# Altium footprint library CONN_HDR_1.27MM_ST_SMD.PcbLib: 118 footprints (part 6 of 8)
Each footprint in its own frame and in the unit in brackets; x right, y up, seen from the top. Pads: shape width x height; smd on the part's side, far side on the other; paste and mask are expansions set on the pad; w line width, h text height; cw(c..) or ccw(c..) is an arc to the next point about the centre after c.
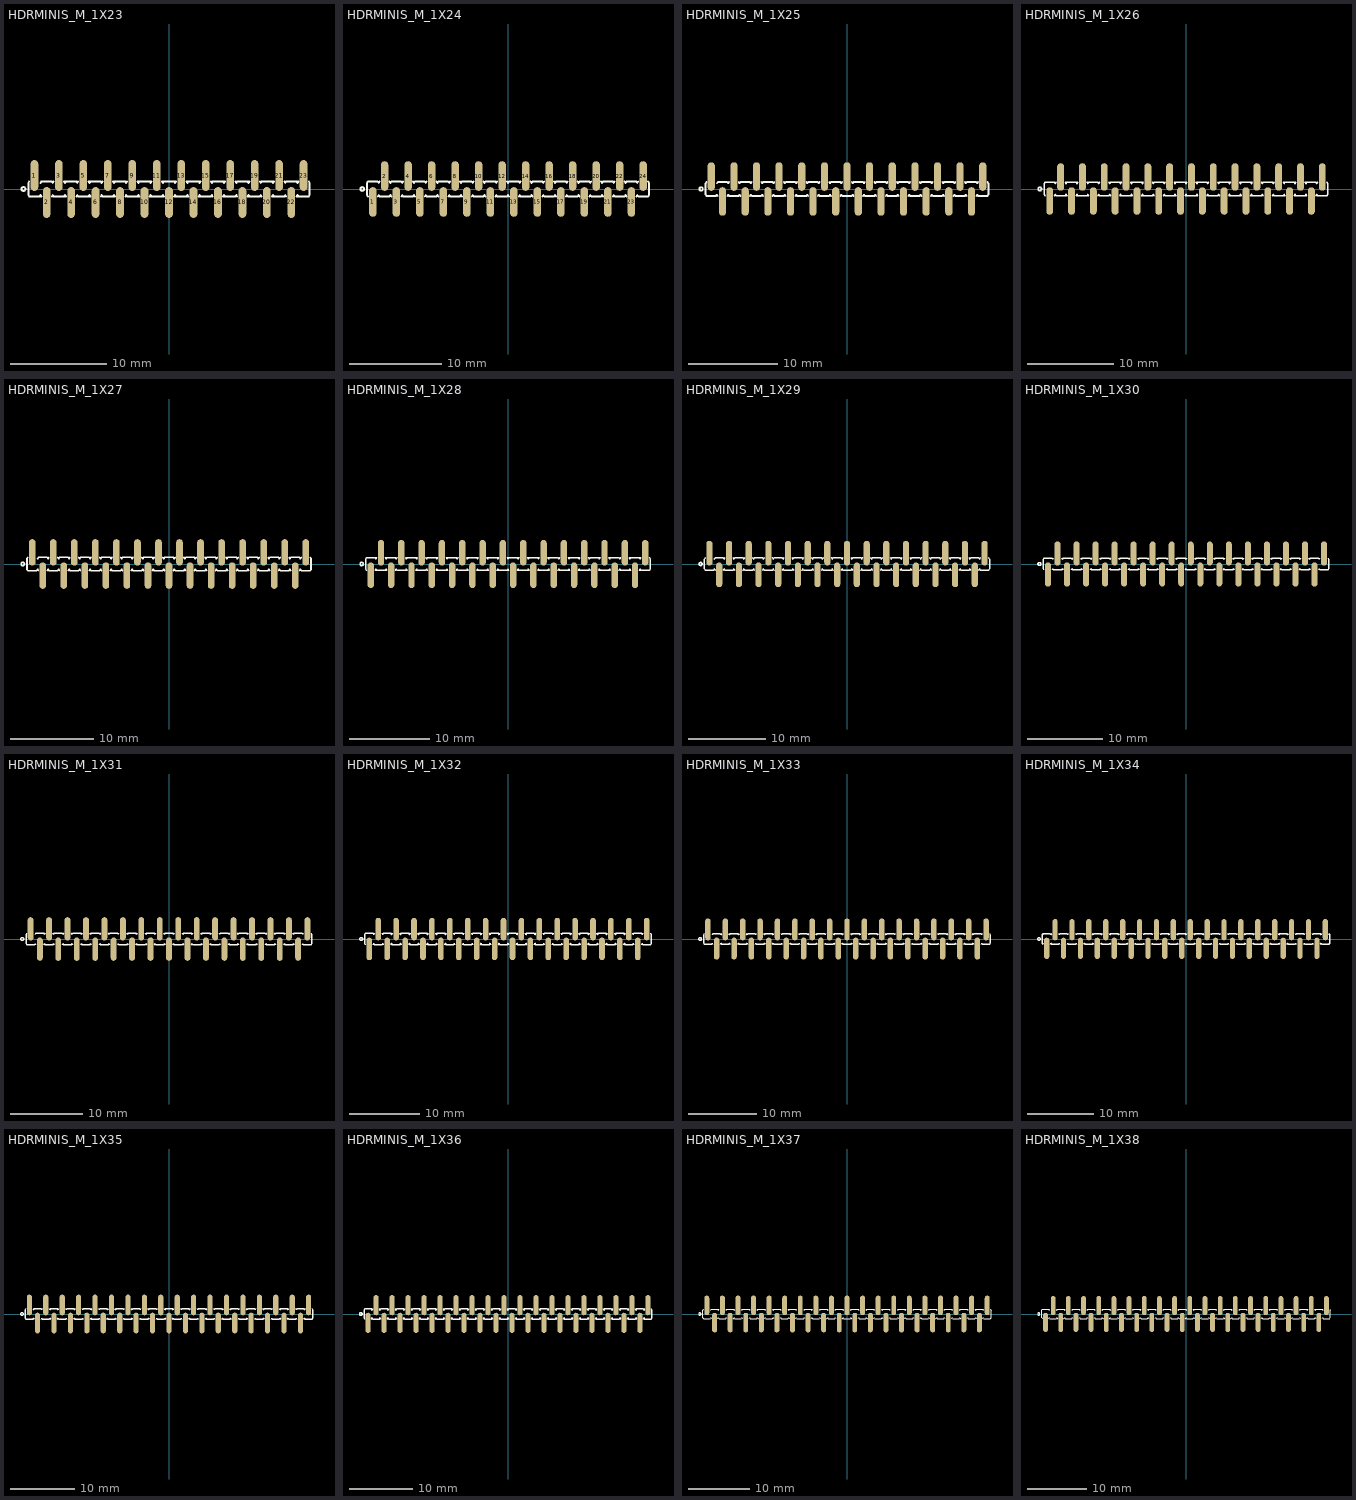
[diagram p5: the footprints below, top view; thin cyan lines are the x and y axes]

## HDRMINIS_M_1X23 [mm] "mini header (50mil pitch)"
pads (23):
  oval 0.8x3.2 smd mask+0.1: 1(-13.97,1.4) 2(-12.7,-1.4) 3(-11.43,1.4) 4(-10.16,-1.4) 5(-8.89,1.4) 6(-7.62,-1.4) 7(-6.35,1.4) 8(-5.08,-1.4) 9(-3.81,1.4) 10(-2.54,-1.4) 11(-1.27,1.4) 12(0,-1.4) 13(1.27,1.4) 14(2.54,-1.4) 15(3.81,1.4) 16(5.08,-1.4) 17(6.35,1.4) 18(7.62,-1.4) 19(8.89,1.4) 20(10.16,-1.4) 21(11.43,1.4) 22(12.7,-1.4) 23(13.97,1.4)
Top Overlay:
  circle w0.2: c-15.113,0 r0.2
  lines w0.2: -14.506,0.8 -14.605,0.635 -14.605,-0.635 -14.506,-0.8 -13.434,-0.8 -13.335,-0.635 -13.236,-0.8 ; -13.335,0.635 -13.236,0.8 -12.164,0.8 -12.065,0.635 -11.966,0.8 ; -12.164,-0.8 -12.065,-0.635 -11.966,-0.8 -10.894,-0.8 -10.795,-0.635 -10.696,-0.8 ; -10.894,0.8 -10.795,0.635 -10.696,0.8 -9.624,0.8 -9.525,0.635 -9.426,0.8 ; -9.624,-0.8 -9.525,-0.635 -9.426,-0.8 -8.354,-0.8 -8.255,-0.635 -8.156,-0.8 ; -8.354,0.8 -8.255,0.635 -8.156,0.8 -7.084,0.8 -6.985,0.635 -6.886,0.8 ; -7.084,-0.8 -6.985,-0.635 -6.886,-0.8 -5.814,-0.8 -5.715,-0.635 -5.616,-0.8 ; -5.814,0.8 -5.715,0.635 -5.616,0.8 -4.544,0.8 -4.445,0.635 -4.346,0.8 ; -4.544,-0.8 -4.445,-0.635 -4.346,-0.8 -3.274,-0.8 -3.175,-0.635 -3.076,-0.8 ; -3.274,0.8 -3.175,0.635 -3.076,0.8 -2.004,0.8 -1.905,0.635 -1.806,0.8 ; -2.004,-0.8 -1.905,-0.635 -1.806,-0.8 -0.734,-0.8 -0.635,-0.635 -0.536,-0.8 ; -0.734,0.8 -0.635,0.635 -0.536,0.8 0.536,0.8 0.635,0.635 0.734,0.8 ; 0.536,-0.8 0.635,-0.635 0.734,-0.8 1.806,-0.8 1.905,-0.635 2.004,-0.8 ; 1.806,0.8 1.905,0.635 2.004,0.8 3.076,0.8 3.175,0.635 3.274,0.8 ; 3.076,-0.8 3.175,-0.635 3.274,-0.8 4.346,-0.8 4.445,-0.635 4.544,-0.8 ; 4.346,0.8 4.445,0.635 4.544,0.8 5.616,0.8 5.715,0.635 5.814,0.8 ; 5.616,-0.8 5.715,-0.635 5.814,-0.8 6.886,-0.8 6.985,-0.635 7.084,-0.8 ; 6.886,0.8 6.985,0.635 7.084,0.8 8.156,0.8 8.255,0.635 8.354,0.8 ; 8.156,-0.8 8.255,-0.635 8.354,-0.8 9.426,-0.8 9.525,-0.635 9.624,-0.8 ; 9.426,0.8 9.525,0.635 9.624,0.8 10.696,0.8 10.795,0.635 10.894,0.8 ; 10.696,-0.8 10.795,-0.635 10.894,-0.8 11.966,-0.8 12.065,-0.635 12.164,-0.8 ; 11.966,0.8 12.065,0.635 12.164,0.8 13.236,0.8 13.335,0.635 13.434,0.8 ; 13.236,-0.8 13.335,-0.635 13.434,-0.8 14.506,-0.8 14.605,-0.635 14.605,0.635 14.506,0.8
3D body "BD021-02A-A1-0350-0200-0550-LB.stp": height 5.5, standoff 0, extent 12.065,-2.75 14.605,2.75
3D body "BD021-02A-A1-0350-0200-0550-LB.stp": height 5.5, standoff 0, extent 9.525,-2.75 12.065,2.75
3D body "BD021-02A-A1-0350-0200-0550-LB.stp": height 5.5, standoff 0, extent 6.985,-2.75 9.525,2.75
3D body "BD021-02A-A1-0350-0200-0550-LB.stp": height 5.5, standoff 0, extent 4.445,-2.75 6.985,2.75
3D body "BD021-02A-A1-0350-0200-0550-LB.stp": height 5.5, standoff 0, extent 1.905,-2.75 4.445,2.75
3D body "BD021-02A-A1-0350-0200-0550-LB.stp": height 5.5, standoff 0, extent -0.635,-2.75 1.905,2.75
3D body "BD021-02A-A1-0350-0200-0550-LB.stp": height 5.5, standoff 0, extent -3.175,-2.75 -0.635,2.75
3D body "BD021-02A-A1-0350-0200-0550-LB.stp": height 5.5, standoff 0, extent -5.715,-2.75 -3.175,2.75
3D body "BD021-02A-A1-0350-0200-0550-LB.stp": height 5.5, standoff 0, extent -8.255,-2.75 -5.715,2.75
3D body "BD021-02A-A1-0350-0200-0550-LB.stp": height 5.5, standoff 0, extent -10.795,-2.75 -8.255,2.75
3D body "BD021-03A-A1-0350-0200-0550-LB.stp": height 5.5, standoff 0, extent -14.61,-2.75 -10.8,2.75

## HDRMINIS_M_1X24 [mm] "mini header (50mil pitch)"
pads (24):
  oval 0.8x3.2 smd mask+0.1: 1(-14.605,-1.4) 2(-13.335,1.4) 3(-12.065,-1.4) 4(-10.795,1.4) 5(-9.525,-1.4) 6(-8.255,1.4) 7(-6.985,-1.4) 8(-5.715,1.4) 9(-4.445,-1.4) 10(-3.175,1.4) 11(-1.905,-1.4) 12(-0.635,1.4) 13(0.635,-1.4) 14(1.905,1.4) 15(3.175,-1.4) 16(4.445,1.4) 17(5.715,-1.4) 18(6.985,1.4) 19(8.255,-1.4) 20(9.525,1.4) 21(10.795,-1.4) 22(12.065,1.4) 23(13.335,-1.4) 24(14.605,1.4)
Top Overlay:
  circle w0.2: c-15.748,0 r0.2
  lines w0.2: -15.141,-0.8 -15.24,-0.635 -15.24,0.635 -15.141,0.8 -14.069,0.8 -13.97,0.635 -13.871,0.8 ; -14.069,-0.8 -13.97,-0.635 -13.871,-0.8 -12.799,-0.8 -12.7,-0.635 -12.601,-0.8 ; -12.799,0.8 -12.7,0.635 -12.601,0.8 -11.529,0.8 -11.43,0.635 -11.331,0.8 ; -11.529,-0.8 -11.43,-0.635 -11.331,-0.8 -10.259,-0.8 -10.16,-0.635 -10.061,-0.8 ; -10.259,0.8 -10.16,0.635 -10.061,0.8 -8.989,0.8 -8.89,0.635 -8.791,0.8 ; -8.989,-0.8 -8.89,-0.635 -8.791,-0.8 -7.719,-0.8 -7.62,-0.635 -7.521,-0.8 ; -7.719,0.8 -7.62,0.635 -7.521,0.8 -6.449,0.8 -6.35,0.635 -6.251,0.8 ; -6.449,-0.8 -6.35,-0.635 -6.251,-0.8 -5.179,-0.8 -5.08,-0.635 -4.981,-0.8 ; -5.179,0.8 -5.08,0.635 -4.981,0.8 -3.909,0.8 -3.81,0.635 -3.711,0.8 ; -3.909,-0.8 -3.81,-0.635 -3.711,-0.8 -2.639,-0.8 -2.54,-0.635 -2.441,-0.8 ; -2.639,0.8 -2.54,0.635 -2.441,0.8 -1.369,0.8 -1.27,0.635 -1.171,0.8 ; -1.369,-0.8 -1.27,-0.635 -1.171,-0.8 -0.099,-0.8 0,-0.635 0.099,-0.8 ; -0.099,0.8 0,0.635 0.099,0.8 1.171,0.8 1.27,0.635 1.369,0.8 ; 1.171,-0.8 1.27,-0.635 1.369,-0.8 2.441,-0.8 2.54,-0.635 2.639,-0.8 ; 2.441,0.8 2.54,0.635 2.639,0.8 3.711,0.8 3.81,0.635 3.909,0.8 ; 3.711,-0.8 3.81,-0.635 3.909,-0.8 4.981,-0.8 5.08,-0.635 5.179,-0.8 ; 4.981,0.8 5.08,0.635 5.179,0.8 6.251,0.8 6.35,0.635 6.449,0.8 ; 6.251,-0.8 6.35,-0.635 6.449,-0.8 7.521,-0.8 7.62,-0.635 7.719,-0.8 ; 7.521,0.8 7.62,0.635 7.719,0.8 8.791,0.8 8.89,0.635 8.989,0.8 ; 8.791,-0.8 8.89,-0.635 8.989,-0.8 10.061,-0.8 10.16,-0.635 10.259,-0.8 ; 10.061,0.8 10.16,0.635 10.259,0.8 11.331,0.8 11.43,0.635 11.529,0.8 ; 11.331,-0.8 11.43,-0.635 11.529,-0.8 12.601,-0.8 12.7,-0.635 12.799,-0.8 ; 12.601,0.8 12.7,0.635 12.799,0.8 13.871,0.8 13.97,0.635 14.069,0.8 ; 13.871,-0.8 13.97,-0.635 14.069,-0.8 15.141,-0.8 15.24,-0.635 15.24,0.635 15.141,0.8
3D body "BD021-02A-A1-0350-0200-0550-LB.stp": height 5.5, standoff 0, extent -15.24,-2.75 -12.7,2.75
3D body "BD021-02A-A1-0350-0200-0550-LB.stp": height 5.5, standoff 0, extent -12.7,-2.75 -10.16,2.75
3D body "BD021-02A-A1-0350-0200-0550-LB.stp": height 5.5, standoff 0, extent -10.16,-2.75 -7.62,2.75
3D body "BD021-02A-A1-0350-0200-0550-LB.stp": height 5.5, standoff 0, extent -7.62,-2.75 -5.08,2.75
3D body "BD021-02A-A1-0350-0200-0550-LB.stp": height 5.5, standoff 0, extent -5.08,-2.75 -2.54,2.75
3D body "BD021-02A-A1-0350-0200-0550-LB.stp": height 5.5, standoff 0, extent -2.54,-2.75 0,2.75
3D body "BD021-02A-A1-0350-0200-0550-LB.stp": height 5.5, standoff 0, extent 0,-2.75 2.54,2.75
3D body "BD021-02A-A1-0350-0200-0550-LB.stp": height 5.5, standoff 0, extent 2.54,-2.75 5.08,2.75
3D body "BD021-02A-A1-0350-0200-0550-LB.stp": height 5.5, standoff 0, extent 5.08,-2.75 7.62,2.75
3D body "BD021-02A-A1-0350-0200-0550-LB.stp": height 5.5, standoff 0, extent 7.62,-2.75 10.16,2.75
3D body "BD021-02A-A1-0350-0200-0550-LB.stp": height 5.5, standoff 0, extent 10.16,-2.75 12.7,2.75
3D body "BD021-02A-A1-0350-0200-0550-LB.stp": height 5.5, standoff 0, extent 12.7,-2.75 15.24,2.75

## HDRMINIS_M_1X25 [mm] "mini header (50mil pitch)"
pads (25):
  oval 0.8x3.2 smd mask+0.1: 1(-15.24,1.4) 2(-13.97,-1.4) 3(-12.7,1.4) 4(-11.43,-1.4) 5(-10.16,1.4) 6(-8.89,-1.4) 7(-7.62,1.4) 8(-6.35,-1.4) 9(-5.08,1.4) 10(-3.81,-1.4) 11(-2.54,1.4) 12(-1.27,-1.4) 13(0,1.4) 14(1.27,-1.4) 15(2.54,1.4) 16(3.81,-1.4) 17(5.08,1.4) 18(6.35,-1.4) 19(7.62,1.4) 20(8.89,-1.4) 21(10.16,1.4) 22(11.43,-1.4) 23(12.7,1.4) 24(13.97,-1.4) 25(15.24,1.4)
Top Overlay:
  circle w0.2: c-16.383,0 r0.2
  lines w0.2: -15.776,0.8 -15.875,0.635 -15.875,-0.635 -15.776,-0.8 -14.704,-0.8 -14.605,-0.635 -14.506,-0.8 ; -14.605,0.635 -14.506,0.8 -13.434,0.8 -13.335,0.635 -13.236,0.8 ; -13.434,-0.8 -13.335,-0.635 -13.236,-0.8 -12.164,-0.8 -12.065,-0.635 -11.966,-0.8 ; -12.164,0.8 -12.065,0.635 -11.966,0.8 -10.894,0.8 -10.795,0.635 -10.696,0.8 ; -10.894,-0.8 -10.795,-0.635 -10.696,-0.8 -9.624,-0.8 -9.525,-0.635 -9.426,-0.8 ; -9.624,0.8 -9.525,0.635 -9.426,0.8 -8.354,0.8 -8.255,0.635 -8.156,0.8 ; -8.354,-0.8 -8.255,-0.635 -8.156,-0.8 -7.084,-0.8 -6.985,-0.635 -6.886,-0.8 ; -7.084,0.8 -6.985,0.635 -6.886,0.8 -5.814,0.8 -5.715,0.635 -5.616,0.8 ; -5.814,-0.8 -5.715,-0.635 -5.616,-0.8 -4.544,-0.8 -4.445,-0.635 -4.346,-0.8 ; -4.544,0.8 -4.445,0.635 -4.346,0.8 -3.274,0.8 -3.175,0.635 -3.076,0.8 ; -3.274,-0.8 -3.175,-0.635 -3.076,-0.8 -2.004,-0.8 -1.905,-0.635 -1.806,-0.8 ; -2.004,0.8 -1.905,0.635 -1.806,0.8 -0.734,0.8 -0.635,0.635 -0.536,0.8 ; -0.734,-0.8 -0.635,-0.635 -0.536,-0.8 0.536,-0.8 0.635,-0.635 0.734,-0.8 ; 0.536,0.8 0.635,0.635 0.734,0.8 1.806,0.8 1.905,0.635 2.004,0.8 ; 1.806,-0.8 1.905,-0.635 2.004,-0.8 3.076,-0.8 3.175,-0.635 3.274,-0.8 ; 3.076,0.8 3.175,0.635 3.274,0.8 4.346,0.8 4.445,0.635 4.544,0.8 ; 4.346,-0.8 4.445,-0.635 4.544,-0.8 5.616,-0.8 5.715,-0.635 5.814,-0.8 ; 5.616,0.8 5.715,0.635 5.814,0.8 6.886,0.8 6.985,0.635 7.084,0.8 ; 6.886,-0.8 6.985,-0.635 7.084,-0.8 8.156,-0.8 8.255,-0.635 8.354,-0.8 ; 8.156,0.8 8.255,0.635 8.354,0.8 9.426,0.8 9.525,0.635 9.624,0.8 ; 9.426,-0.8 9.525,-0.635 9.624,-0.8 10.696,-0.8 10.795,-0.635 10.894,-0.8 ; 10.696,0.8 10.795,0.635 10.894,0.8 11.966,0.8 12.065,0.635 12.164,0.8 ; 11.966,-0.8 12.065,-0.635 12.164,-0.8 13.236,-0.8 13.335,-0.635 13.434,-0.8 ; 13.236,0.8 13.335,0.635 13.434,0.8 14.506,0.8 14.605,0.635 14.704,0.8 ; 14.506,-0.8 14.605,-0.635 14.704,-0.8 15.776,-0.8 15.875,-0.635 15.875,0.635 15.776,0.8
3D body "BD021-03A-A1-0350-0200-0550-LB.stp": height 5.5, standoff 0, extent -15.88,-2.75 -12.07,2.75
3D body "BD021-02A-A1-0350-0200-0550-LB.stp": height 5.5, standoff 0, extent -12.065,-2.75 -9.525,2.75
3D body "BD021-02A-A1-0350-0200-0550-LB.stp": height 5.5, standoff 0, extent -9.525,-2.75 -6.985,2.75
3D body "BD021-02A-A1-0350-0200-0550-LB.stp": height 5.5, standoff 0, extent -6.985,-2.75 -4.445,2.75
3D body "BD021-02A-A1-0350-0200-0550-LB.stp": height 5.5, standoff 0, extent -4.445,-2.75 -1.905,2.75
3D body "BD021-02A-A1-0350-0200-0550-LB.stp": height 5.5, standoff 0, extent -1.905,-2.75 0.635,2.75
3D body "BD021-02A-A1-0350-0200-0550-LB.stp": height 5.5, standoff 0, extent 0.635,-2.75 3.175,2.75
3D body "BD021-02A-A1-0350-0200-0550-LB.stp": height 5.5, standoff 0, extent 3.175,-2.75 5.715,2.75
3D body "BD021-02A-A1-0350-0200-0550-LB.stp": height 5.5, standoff 0, extent 5.715,-2.75 8.255,2.75
3D body "BD021-02A-A1-0350-0200-0550-LB.stp": height 5.5, standoff 0, extent 8.255,-2.75 10.795,2.75
3D body "BD021-02A-A1-0350-0200-0550-LB.stp": height 5.5, standoff 0, extent 10.795,-2.75 13.335,2.75
3D body "BD021-02A-A1-0350-0200-0550-LB.stp": height 5.5, standoff 0, extent 13.335,-2.75 15.875,2.75

## HDRMINIS_M_1X26 [mm] "mini header (50mil pitch)"
pads (26):
  oval 0.8x3.2 smd mask+0.1: 1(-15.875,-1.4) 2(-14.605,1.4) 3(-13.335,-1.4) 4(-12.065,1.4) 5(-10.795,-1.4) 6(-9.525,1.4) 7(-8.255,-1.4) 8(-6.985,1.4) 9(-5.715,-1.4) 10(-4.445,1.4) 11(-3.175,-1.4) 12(-1.905,1.4) 13(-0.635,-1.4) 14(0.635,1.4) 15(1.905,-1.4) 16(3.175,1.4) 17(4.445,-1.4) 18(5.715,1.4) 19(6.985,-1.4) 20(8.255,1.4) 21(9.525,-1.4) 22(10.795,1.4) 23(12.065,-1.4) 24(13.335,1.4) 25(14.605,-1.4) 26(15.875,1.4)
Top Overlay:
  circle w0.2: c-17.018,0 r0.2
  lines w0.2: -16.411,-0.8 -16.51,-0.635 -16.51,0.635 -16.411,0.8 -15.339,0.8 -15.24,0.635 -15.141,0.8 ; -15.339,-0.8 -15.24,-0.635 -15.141,-0.8 -14.069,-0.8 -13.97,-0.635 -13.871,-0.8 ; -14.069,0.8 -13.97,0.635 -13.871,0.8 -12.799,0.8 -12.7,0.635 -12.601,0.8 ; -12.799,-0.8 -12.7,-0.635 -12.601,-0.8 -11.529,-0.8 -11.43,-0.635 -11.331,-0.8 ; -11.529,0.8 -11.43,0.635 -11.331,0.8 -10.259,0.8 -10.16,0.635 -10.061,0.8 ; -10.259,-0.8 -10.16,-0.635 -10.061,-0.8 -8.989,-0.8 -8.89,-0.635 -8.791,-0.8 ; -8.989,0.8 -8.89,0.635 -8.791,0.8 -7.719,0.8 -7.62,0.635 -7.521,0.8 ; -7.719,-0.8 -7.62,-0.635 -7.521,-0.8 -6.449,-0.8 -6.35,-0.635 -6.251,-0.8 ; -6.449,0.8 -6.35,0.635 -6.251,0.8 -5.179,0.8 -5.08,0.635 -4.981,0.8 ; -5.179,-0.8 -5.08,-0.635 -4.981,-0.8 -3.909,-0.8 -3.81,-0.635 -3.711,-0.8 ; -3.909,0.8 -3.81,0.635 -3.711,0.8 -2.639,0.8 -2.54,0.635 -2.441,0.8 ; -2.639,-0.8 -2.54,-0.635 -2.441,-0.8 -1.369,-0.8 -1.27,-0.635 -1.171,-0.8 ; -1.369,0.8 -1.27,0.635 -1.171,0.8 -0.099,0.8 0,0.635 0.099,0.8 ; -0.099,-0.8 0,-0.635 0.099,-0.8 1.171,-0.8 1.27,-0.635 1.369,-0.8 ; 1.171,0.8 1.27,0.635 1.369,0.8 2.441,0.8 2.54,0.635 2.639,0.8 ; 2.441,-0.8 2.54,-0.635 2.639,-0.8 3.711,-0.8 3.81,-0.635 3.909,-0.8 ; 3.711,0.8 3.81,0.635 3.909,0.8 4.981,0.8 5.08,0.635 5.179,0.8 ; 4.981,-0.8 5.08,-0.635 5.179,-0.8 6.251,-0.8 6.35,-0.635 6.449,-0.8 ; 6.251,0.8 6.35,0.635 6.449,0.8 7.521,0.8 7.62,0.635 7.719,0.8 ; 7.521,-0.8 7.62,-0.635 7.719,-0.8 8.791,-0.8 8.89,-0.635 8.989,-0.8 ; 8.791,0.8 8.89,0.635 8.989,0.8 10.061,0.8 10.16,0.635 10.259,0.8 ; 10.061,-0.8 10.16,-0.635 10.259,-0.8 11.331,-0.8 11.43,-0.635 11.529,-0.8 ; 11.331,0.8 11.43,0.635 11.529,0.8 12.601,0.8 12.7,0.635 12.799,0.8 ; 12.601,-0.8 12.7,-0.635 12.799,-0.8 13.871,-0.8 13.97,-0.635 14.069,-0.8 ; 13.871,0.8 13.97,0.635 14.069,0.8 15.141,0.8 15.24,0.635 15.339,0.8 ; 15.141,-0.8 15.24,-0.635 15.339,-0.8 16.411,-0.8 16.51,-0.635 16.51,0.635 16.411,0.8
3D body "BD021-02A-A1-0350-0200-0550-LB.stp": height 5.5, standoff 0, extent -16.51,-2.75 -13.97,2.75
3D body "BD021-02A-A1-0350-0200-0550-LB.stp": height 5.5, standoff 0, extent -13.97,-2.75 -11.43,2.75
3D body "BD021-02A-A1-0350-0200-0550-LB.stp": height 5.5, standoff 0, extent -11.43,-2.75 -8.89,2.75
3D body "BD021-02A-A1-0350-0200-0550-LB.stp": height 5.5, standoff 0, extent -8.89,-2.75 -6.35,2.75
3D body "BD021-02A-A1-0350-0200-0550-LB.stp": height 5.5, standoff 0, extent -6.35,-2.75 -3.81,2.75
3D body "BD021-02A-A1-0350-0200-0550-LB.stp": height 5.5, standoff 0, extent -3.81,-2.75 -1.27,2.75
3D body "BD021-02A-A1-0350-0200-0550-LB.stp": height 5.5, standoff 0, extent -1.27,-2.75 1.27,2.75
3D body "BD021-02A-A1-0350-0200-0550-LB.stp": height 5.5, standoff 0, extent 1.27,-2.75 3.81,2.75
3D body "BD021-02A-A1-0350-0200-0550-LB.stp": height 5.5, standoff 0, extent 3.81,-2.75 6.35,2.75
3D body "BD021-02A-A1-0350-0200-0550-LB.stp": height 5.5, standoff 0, extent 6.35,-2.75 8.89,2.75
3D body "BD021-02A-A1-0350-0200-0550-LB.stp": height 5.5, standoff 0, extent 8.89,-2.75 11.43,2.75
3D body "BD021-02A-A1-0350-0200-0550-LB.stp": height 5.5, standoff 0, extent 11.43,-2.75 13.97,2.75
3D body "BD021-02A-A1-0350-0200-0550-LB.stp": height 5.5, standoff 0, extent 13.97,-2.75 16.51,2.75

## HDRMINIS_M_1X27 [mm] "mini header (50mil pitch)"
pads (27):
  oval 0.8x3.2 smd mask+0.1: 1(-16.51,1.4) 2(-15.24,-1.4) 3(-13.97,1.4) 4(-12.7,-1.4) 5(-11.43,1.4) 6(-10.16,-1.4) 7(-8.89,1.4) 8(-7.62,-1.4) 9(-6.35,1.4) 10(-5.08,-1.4) 11(-3.81,1.4) 12(-2.54,-1.4) 13(-1.27,1.4) 14(0,-1.4) 15(1.27,1.4) 16(2.54,-1.4) 17(3.81,1.4) 18(5.08,-1.4) 19(6.35,1.4) 20(7.62,-1.4) 21(8.89,1.4) 22(10.16,-1.4) 23(11.43,1.4) 24(12.7,-1.4) 25(13.97,1.4) 26(15.24,-1.4) 27(16.51,1.4)
Top Overlay:
  circle w0.2: c-17.653,0 r0.2
  lines w0.2: -17.046,0.8 -17.145,0.635 -17.145,-0.635 -17.046,-0.8 -15.974,-0.8 -15.875,-0.635 -15.776,-0.8 ; -15.875,0.635 -15.776,0.8 -14.704,0.8 -14.605,0.635 -14.506,0.8 ; -14.704,-0.8 -14.605,-0.635 -14.506,-0.8 -13.434,-0.8 -13.335,-0.635 -13.236,-0.8 ; -13.434,0.8 -13.335,0.635 -13.236,0.8 -12.164,0.8 -12.065,0.635 -11.966,0.8 ; -12.164,-0.8 -12.065,-0.635 -11.966,-0.8 -10.894,-0.8 -10.795,-0.635 -10.696,-0.8 ; -10.894,0.8 -10.795,0.635 -10.696,0.8 -9.624,0.8 -9.525,0.635 -9.426,0.8 ; -9.624,-0.8 -9.525,-0.635 -9.426,-0.8 -8.354,-0.8 -8.255,-0.635 -8.156,-0.8 ; -8.354,0.8 -8.255,0.635 -8.156,0.8 -7.084,0.8 -6.985,0.635 -6.886,0.8 ; -7.084,-0.8 -6.985,-0.635 -6.886,-0.8 -5.814,-0.8 -5.715,-0.635 -5.616,-0.8 ; -5.814,0.8 -5.715,0.635 -5.616,0.8 -4.544,0.8 -4.445,0.635 -4.346,0.8 ; -4.544,-0.8 -4.445,-0.635 -4.346,-0.8 -3.274,-0.8 -3.175,-0.635 -3.076,-0.8 ; -3.274,0.8 -3.175,0.635 -3.076,0.8 -2.004,0.8 -1.905,0.635 -1.806,0.8 ; -2.004,-0.8 -1.905,-0.635 -1.806,-0.8 -0.734,-0.8 -0.635,-0.635 -0.536,-0.8 ; -0.734,0.8 -0.635,0.635 -0.536,0.8 0.536,0.8 0.635,0.635 0.734,0.8 ; 0.536,-0.8 0.635,-0.635 0.734,-0.8 1.806,-0.8 1.905,-0.635 2.004,-0.8 ; 1.806,0.8 1.905,0.635 2.004,0.8 3.076,0.8 3.175,0.635 3.274,0.8 ; 3.076,-0.8 3.175,-0.635 3.274,-0.8 4.346,-0.8 4.445,-0.635 4.544,-0.8 ; 4.346,0.8 4.445,0.635 4.544,0.8 5.616,0.8 5.715,0.635 5.814,0.8 ; 5.616,-0.8 5.715,-0.635 5.814,-0.8 6.886,-0.8 6.985,-0.635 7.084,-0.8 ; 6.886,0.8 6.985,0.635 7.084,0.8 8.156,0.8 8.255,0.635 8.354,0.8 ; 8.156,-0.8 8.255,-0.635 8.354,-0.8 9.426,-0.8 9.525,-0.635 9.624,-0.8 ; 9.426,0.8 9.525,0.635 9.624,0.8 10.696,0.8 10.795,0.635 10.894,0.8 ; 10.696,-0.8 10.795,-0.635 10.894,-0.8 11.966,-0.8 12.065,-0.635 12.164,-0.8 ; 11.966,0.8 12.065,0.635 12.164,0.8 13.236,0.8 13.335,0.635 13.434,0.8 ; 13.236,-0.8 13.335,-0.635 13.434,-0.8 14.506,-0.8 14.605,-0.635 14.704,-0.8 ; 14.506,0.8 14.605,0.635 14.704,0.8 15.776,0.8 15.875,0.635 15.974,0.8 ; 15.776,-0.8 15.875,-0.635 15.974,-0.8 17.046,-0.8 17.145,-0.635 17.145,0.635 17.046,0.8
3D body "BD021-02A-A1-0350-0200-0550-LB.stp": height 5.5, standoff 0, extent 14.605,-2.75 17.145,2.75
3D body "BD021-02A-A1-0350-0200-0550-LB.stp": height 5.5, standoff 0, extent 12.065,-2.75 14.605,2.75
3D body "BD021-02A-A1-0350-0200-0550-LB.stp": height 5.5, standoff 0, extent 9.525,-2.75 12.065,2.75
3D body "BD021-02A-A1-0350-0200-0550-LB.stp": height 5.5, standoff 0, extent 6.985,-2.75 9.525,2.75
3D body "BD021-02A-A1-0350-0200-0550-LB.stp": height 5.5, standoff 0, extent 4.445,-2.75 6.985,2.75
3D body "BD021-02A-A1-0350-0200-0550-LB.stp": height 5.5, standoff 0, extent 1.905,-2.75 4.445,2.75
3D body "BD021-02A-A1-0350-0200-0550-LB.stp": height 5.5, standoff 0, extent -0.635,-2.75 1.905,2.75
3D body "BD021-02A-A1-0350-0200-0550-LB.stp": height 5.5, standoff 0, extent -3.175,-2.75 -0.635,2.75
3D body "BD021-02A-A1-0350-0200-0550-LB.stp": height 5.5, standoff 0, extent -5.715,-2.75 -3.175,2.75
3D body "BD021-02A-A1-0350-0200-0550-LB.stp": height 5.5, standoff 0, extent -8.255,-2.75 -5.715,2.75
3D body "BD021-02A-A1-0350-0200-0550-LB.stp": height 5.5, standoff 0, extent -10.795,-2.75 -8.255,2.75
3D body "BD021-02A-A1-0350-0200-0550-LB.stp": height 5.5, standoff 0, extent -13.335,-2.75 -10.795,2.75
3D body "BD021-03A-A1-0350-0200-0550-LB.stp": height 5.5, standoff 0, extent -17.15,-2.75 -13.34,2.75

## HDRMINIS_M_1X28 [mm] "mini header (50mil pitch)"
pads (28):
  oval 0.8x3.2 smd mask+0.1: 1(-17.145,-1.4) 2(-15.875,1.4) 3(-14.605,-1.4) 4(-13.335,1.4) 5(-12.065,-1.4) 6(-10.795,1.4) 7(-9.525,-1.4) 8(-8.255,1.4) 9(-6.985,-1.4) 10(-5.715,1.4) 11(-4.445,-1.4) 12(-3.175,1.4) 13(-1.905,-1.4) 14(-0.635,1.4) 15(0.635,-1.4) 16(1.905,1.4) 17(3.175,-1.4) 18(4.445,1.4) 19(5.715,-1.4) 20(6.985,1.4) 21(8.255,-1.4) 22(9.525,1.4) 23(10.795,-1.4) 24(12.065,1.4) 25(13.335,-1.4) 26(14.605,1.4) 27(15.875,-1.4) 28(17.145,1.4)
Top Overlay:
  circle w0.2: c-18.288,0 r0.2
  lines w0.2: -17.681,-0.8 -17.78,-0.635 -17.78,0.635 -17.681,0.8 -16.609,0.8 -16.51,0.635 -16.411,0.8 ; -16.609,-0.8 -16.51,-0.635 -16.411,-0.8 -15.339,-0.8 -15.24,-0.635 -15.141,-0.8 ; -15.339,0.8 -15.24,0.635 -15.141,0.8 -14.069,0.8 -13.97,0.635 -13.871,0.8 ; -14.069,-0.8 -13.97,-0.635 -13.871,-0.8 -12.799,-0.8 -12.7,-0.635 -12.601,-0.8 ; -12.799,0.8 -12.7,0.635 -12.601,0.8 -11.529,0.8 -11.43,0.635 -11.331,0.8 ; -11.529,-0.8 -11.43,-0.635 -11.331,-0.8 -10.259,-0.8 -10.16,-0.635 -10.061,-0.8 ; -10.259,0.8 -10.16,0.635 -10.061,0.8 -8.989,0.8 -8.89,0.635 -8.791,0.8 ; -8.989,-0.8 -8.89,-0.635 -8.791,-0.8 -7.719,-0.8 -7.62,-0.635 -7.521,-0.8 ; -7.719,0.8 -7.62,0.635 -7.521,0.8 -6.449,0.8 -6.35,0.635 -6.251,0.8 ; -6.449,-0.8 -6.35,-0.635 -6.251,-0.8 -5.179,-0.8 -5.08,-0.635 -4.981,-0.8 ; -5.179,0.8 -5.08,0.635 -4.981,0.8 -3.909,0.8 -3.81,0.635 -3.711,0.8 ; -3.909,-0.8 -3.81,-0.635 -3.711,-0.8 -2.639,-0.8 -2.54,-0.635 -2.441,-0.8 ; -2.639,0.8 -2.54,0.635 -2.441,0.8 -1.369,0.8 -1.27,0.635 -1.171,0.8 ; -1.369,-0.8 -1.27,-0.635 -1.171,-0.8 -0.099,-0.8 0,-0.635 0.099,-0.8 ; -0.099,0.8 0,0.635 0.099,0.8 1.171,0.8 1.27,0.635 1.369,0.8 ; 1.171,-0.8 1.27,-0.635 1.369,-0.8 2.441,-0.8 2.54,-0.635 2.639,-0.8 ; 2.441,0.8 2.54,0.635 2.639,0.8 3.711,0.8 3.81,0.635 3.909,0.8 ; 3.711,-0.8 3.81,-0.635 3.909,-0.8 4.981,-0.8 5.08,-0.635 5.179,-0.8 ; 4.981,0.8 5.08,0.635 5.179,0.8 6.251,0.8 6.35,0.635 6.449,0.8 ; 6.251,-0.8 6.35,-0.635 6.449,-0.8 7.521,-0.8 7.62,-0.635 7.719,-0.8 ; 7.521,0.8 7.62,0.635 7.719,0.8 8.791,0.8 8.89,0.635 8.989,0.8 ; 8.791,-0.8 8.89,-0.635 8.989,-0.8 10.061,-0.8 10.16,-0.635 10.259,-0.8 ; 10.061,0.8 10.16,0.635 10.259,0.8 11.331,0.8 11.43,0.635 11.529,0.8 ; 11.331,-0.8 11.43,-0.635 11.529,-0.8 12.601,-0.8 12.7,-0.635 12.799,-0.8 ; 12.601,0.8 12.7,0.635 12.799,0.8 13.871,0.8 13.97,0.635 14.069,0.8 ; 13.871,-0.8 13.97,-0.635 14.069,-0.8 15.141,-0.8 15.24,-0.635 15.339,-0.8 ; 15.141,0.8 15.24,0.635 15.339,0.8 16.411,0.8 16.51,0.635 16.609,0.8 ; 16.411,-0.8 16.51,-0.635 16.609,-0.8 17.681,-0.8 17.78,-0.635 17.78,0.635 17.681,0.8
3D body "BD021-02A-A1-0350-0200-0550-LB.stp": height 5.5, standoff 0, extent -17.78,-2.75 -15.24,2.75
3D body "BD021-02A-A1-0350-0200-0550-LB.stp": height 5.5, standoff 0, extent -15.24,-2.75 -12.7,2.75
3D body "BD021-02A-A1-0350-0200-0550-LB.stp": height 5.5, standoff 0, extent -12.7,-2.75 -10.16,2.75
3D body "BD021-02A-A1-0350-0200-0550-LB.stp": height 5.5, standoff 0, extent -10.16,-2.75 -7.62,2.75
3D body "BD021-02A-A1-0350-0200-0550-LB.stp": height 5.5, standoff 0, extent -7.62,-2.75 -5.08,2.75
3D body "BD021-02A-A1-0350-0200-0550-LB.stp": height 5.5, standoff 0, extent -5.08,-2.75 -2.54,2.75
3D body "BD021-02A-A1-0350-0200-0550-LB.stp": height 5.5, standoff 0, extent -2.54,-2.75 0,2.75
3D body "BD021-02A-A1-0350-0200-0550-LB.stp": height 5.5, standoff 0, extent 0,-2.75 2.54,2.75
3D body "BD021-02A-A1-0350-0200-0550-LB.stp": height 5.5, standoff 0, extent 2.54,-2.75 5.08,2.75